# Altium footprint library LJ_Mosfet_Power.PcbLib: 96 footprints (part 3 of 6)
Each footprint in its own frame and in the unit in brackets; x right, y up, seen from the top. Pads: shape width x height; smd on the part's side, far side on the other; paste and mask are expansions set on the pad; w line width, h text height; cw(c..) or ccw(c..) is an arc to the next point about the centre after c.
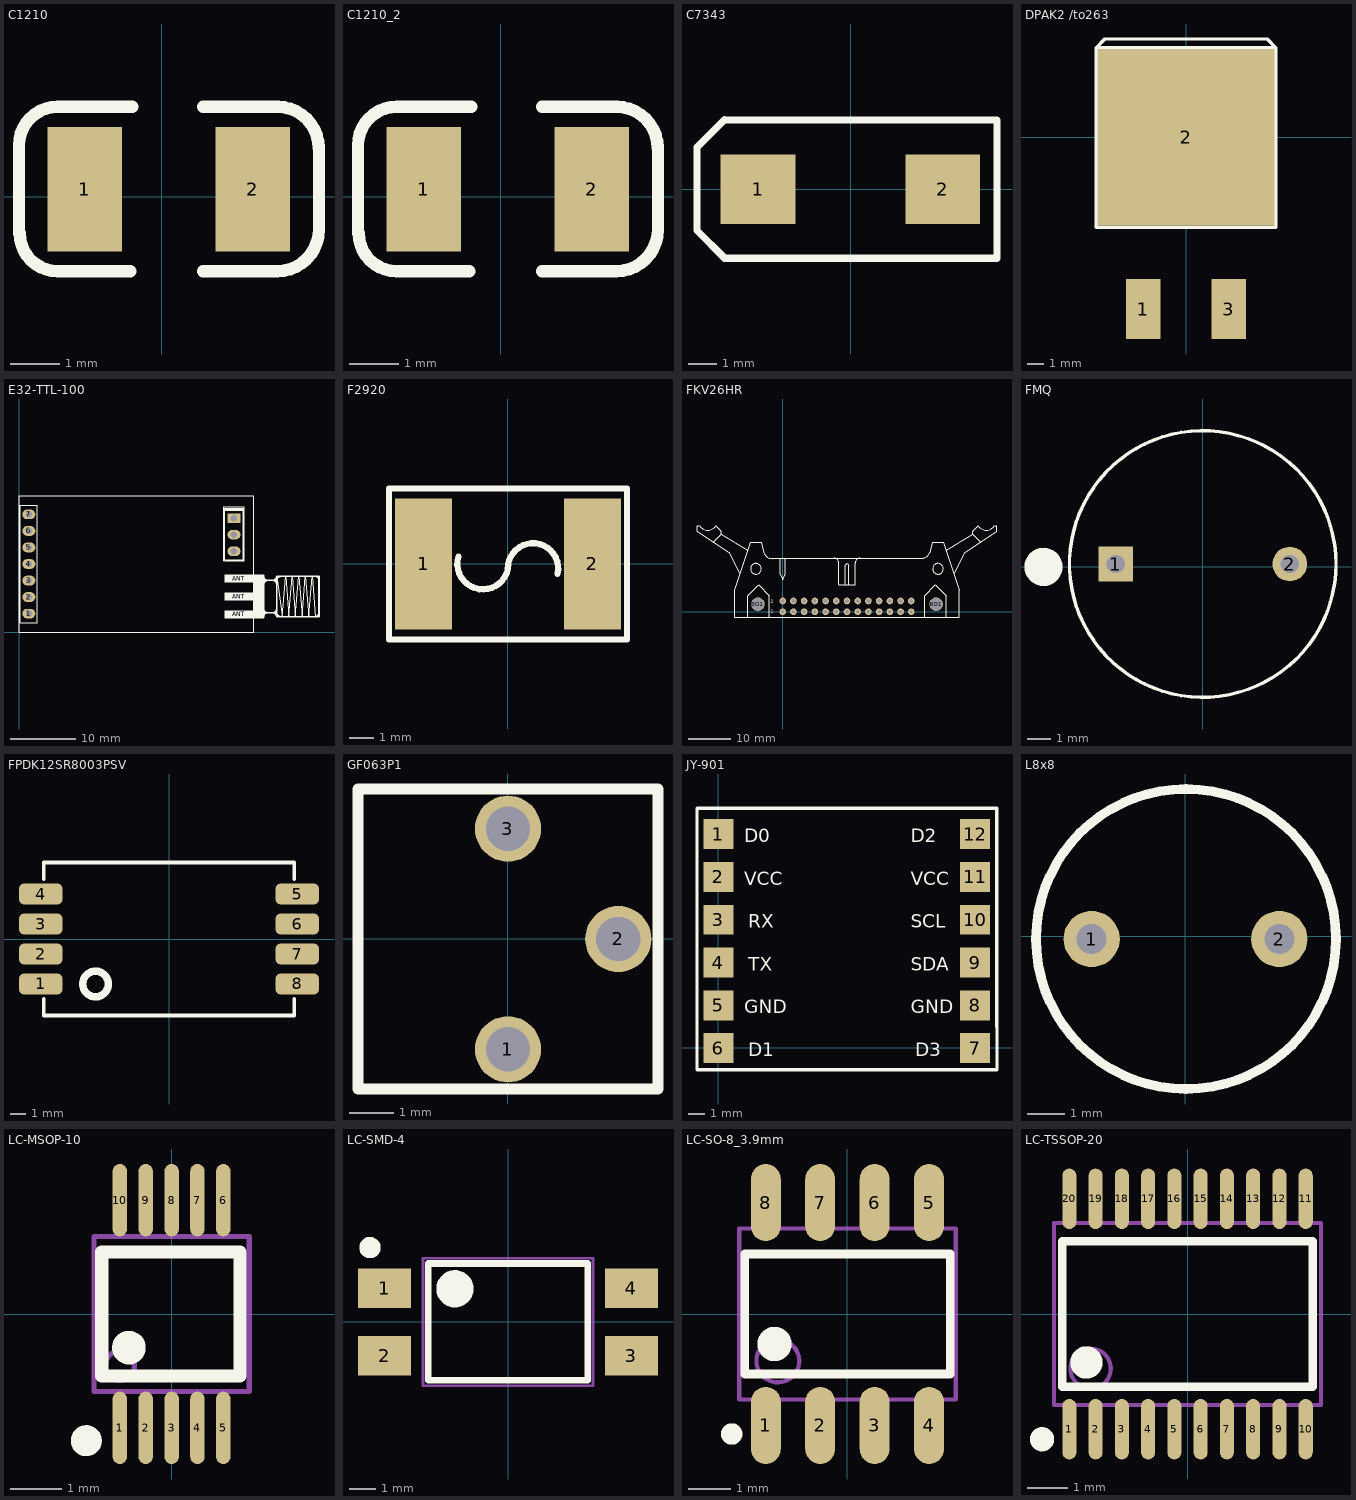
[diagram p2: the footprints below, top view; thin cyan lines are the x and y axes]

## C1210 [mil]
pads (2):
  rect 60x100 smd: 1(-62,6) 2(73,6)
Top Overlay:
  lines w10: -114.8,-29.36 -114.8,41.08 cw(c-83.75,41.08) -83.75,72.13 ; -114.27,-29.36 ccw(c-83.63,-29.36) -83.63,-60 -25.3,-60 ; -83.75,72 -24,72 ; 33,-60 92.52,-60 ccw(c92.52,-26.32) 126.2,-26.32 126.2,39.82 ; 33,72 93.32,72 ; 93,72 cw(c93,39.12) 125.88,39.12
3D body "1210(3225M) Cap.STEP": height 67.1, standoff 0, extent -72.75,-43.99 84.75,54.01

## C1210_2 [mil]
pads (2):
  rect 60x100 smd: 1(-62,6) 2(73,6)
Top Overlay:
  lines w10: -114.8,-29.36 -114.8,41.08 cw(c-83.75,41.08) -83.75,72.13 ; -114.27,-29.36 ccw(c-83.63,-29.36) -83.63,-60 -25.3,-60 ; -83.75,72 -24,72 ; 33,-60 92.52,-60 ccw(c92.52,-26.32) 126.2,-26.32 126.2,39.82 ; 33,72 93.32,72 ; 93,72 cw(c93,39.12) 125.88,39.12
3D body "1210(3225M) Cap.STEP": height 67.1, standoff 0, extent -72.75,-44 84.75,54

## C7343 [mm] "D型"
pads (2):
  rect 2.6x2.4 smd: 1(-3.202,0.007) 2(3.198,0.007)
Top Overlay:
  lines w0.254: -4.369,-2.388 5.08,-2.388 5.08,2.388 ; -4.362,-2.388 -5.325,-1.425 -5.325,1.457 -4.369,2.413 5.08,2.406
3D body "TAJ-D.STEP": height 2.9, standoff 0, extent -3.65,-2.124 3.65,2.176
3D body: height 0.3, standoff 0, extent 3.308,-0.855 3.512,0.915
3D body: height 0.3, standoff 0, extent -3.487,-0.869 -3.392,0.82

## DPAK2 /to263 [mm]
pads (3):
  rect 2.032x3.556 smd: 1(-2.54,-10.2) 3(2.54,-10.2)
  rect 10.5x10.5 smd: 2(0,0)
Top Overlay:
  lines w0.203: -5.334,5.334 5.334,5.334 ; -5.334,5.334 -5.334,-5.334 5.334,-5.334 5.334,5.334 ; -5.334,5.334 -4.826,5.842 4.826,5.842 5.334,5.334

## E32-TTL-100 [mm] "无线模块"
pads (13):
  oval 2x1.5 hole 0.9: 1(1.51,2.88) 2(1.51,5.42) 3(1.51,7.96) 4(1.51,10.5) 5(1.51,13.04) 6(1.51,15.58) 7(1.51,18.12)
  rect 4.5x1.2 on Top Overlay: ANT(33.8,2.75) ANT(33.8,5.5) ANT(33.8,8.25)
  oval 2x1.5 hole 1: NUL(33,12.46) NUL(33,15)
  rect 2x1.5 hole 1: NUL(33,17.54)
Top Overlay:
  region: 31.62,19.09 31.62,18.78 34.42,18.78 34.42,19.09
  rectangle: 36.05,2.25 37.55,8.75
  lines w0.1: 39.55,8.6 40.4,2.4 40.92,8.6 41.43,2.4 41.94,8.6 42.42,2.4 42.94,8.6 43.45,2.4 43.94,8.6 44.46,2.4 44.98,8.6 45.49,2.4 ; 0,0 36.068,0 36.068,21 0,21 0,0
  lines w0.127: 31.62,18.78 31.62,11.19 34.42,11.19 34.42,18.78 ; 31.62,18.78 31.62,19.09 34.42,19.09 34.42,18.78 ; 31.62,18.78 34.42,18.78 ; 0.21,1.5 2.81,1.5 2.81,19.5 0.21,19.5 0.21,1.5 ; 31.41,10.99 34.6,10.99 34.6,19.28 31.41,19.28 31.41,10.99
  lines w0.254: 37.38,3 39.55,3 ; 37.55,2.45 cw(c38.1,2.45) 38.1,3 38.95,3 cw(c38.95,2.4) 39.55,2.4 ; 37.55,4.02 37.55,3.65 ccw(c38.2,3.65) 38.2,3 38.92,3 ccw(c38.92,3.63) 39.55,3.63 ; 37.55,6.38 37.55,7.3 cw(c38.25,7.3) 38.25,8 38.95,8 ; 37.55,8 39.55,8 ; 39.55,3.08 ccw(c40.23,3.08) 40.23,2.4 40.38,2.4 ; 39.55,7.4 ccw(c38.95,7.4) 38.95,8 ; 39.55,7.99 cw(c40.16,7.99) 40.16,8.6 ; 45.11,8.6 45.51,8.6 cw(c45.51,8.06) 46.05,8.06 ; 45.2,2.4 45.43,2.4 ccw(c45.43,3.02) 46.05,3.02 ; 37.55,8.75 37.55,8.63 ccw(c38.18,8.63) 38.18,8 38.95,8 ; 37.55,8.75 37.55,2.25 36.05,2.25 36.05,8.75 37.55,8.75 ; 38.95,8 ccw(c38.95,8.6) 39.55,8.6 ; 39.55,2.4 46.05,2.4 46.05,8.6 39.55,8.6 ; 39.55,2.4 39.55,8.6

## F2920 [mm] "7452"
pads (2):
  rect 2.3x5.3 smd: 1(-3.4,0) 2(3.4,0)
Top Overlay:
  lines w0.254: -2,0.3 ccw(c-1.012,0.007) 0.018,0 ; -0.009,-0.2 cw(c1.008,-0.178) 2,-0.4 ; -4.8,-3.048 -4.8,3.048 4.8,3.048 4.8,-3.048 -4.8,-3.048
3D body: height 1, standoff 0, extent -2.878,-2.718 3.18,2.667
3D body: height 1, standoff 0, extent -3.576,-2.718 -2.878,2.667
3D body: height 1, standoff 0, extent 2.7,-2.692 3.399,2.692

## FKV26HR [mil]
pads (28):
  round 62 hole 35: 1(0,0) 2(0,100) 3(100,0) 4(100,100) 5(200,0) 6(200,100) 7(300,0) 8(300,100) 9(400,0) 10(400,100) 11(500,0) 12(500,100) 13(600,0) 14(600,100) 15(700,0) 16(700,100) 17(800,0) 18(800,100) 19(900,0) 20(900,100) 21(1000,0) 22(1000,100) 23(1100,0) 24(1100,100) 25(1200,0) 26(1200,100)
  round 126 hole 116: BO1(1431.67,70) BO2(-231.67,70)
Top Overlay:
  circle w8: c-250,400 r50
  circle w8: c1450,400 r50
  lines w8: -775,800 -800,800 -800,750 -500,550 -400,350 ; -774.61,799.67 ccw(c-700,850) -625.39,799.67 ; -650,650 -575,725 ; -625,800 -575,750 -575,725 ; -325,-50 -325,150 -225,250 -125,150 -125,-50 ; -325,575 -575,725 ; -175.29,550.54 ccw(c-100,575) -100,495.83 ; -175,550 -200,650 -300,650 -450,200 -450,-50 1650,-50 1650,200 1500,650 1400,650 1375,550 ; -100,500 1300,500 ccw(c1300,575) 1371.33,551.82 ; -25,500 -25,350 0,300 25,350 25,500 ; 475,500 cw(c475,450) 525,450 525,250 675,250 675,450 cw(c725,450) 725,500 ; 583.33,250 583.33,433.33 600,450 616.67,433.33 616.67,250 ; 1325,-50 1325,150 1425,250 1525,150 1525,-50 ; 1525,575 1775,725 ; 1600,350 1700,550 2000,750 2000,800 1975,800 ; 1825,800 1775,750 1775,725 ; 1825.39,799.67 ccw(c1900,850) 1974.61,799.67 ; 1850,650 1775,725
  text "1" at -111,-14 h31.5
  text "2" at -111,80 h31.5

## FMQ [mm]
pads (2):
  rect 1.5x1.5 hole 0.8: 1(-3.775,0.127)
  round 1.5 hole 0.8: 2(3.775,0.127)
Top Overlay:
  circle w0.15: c0,0.127 r5.778
  circle w1: c-6.901,0.002 r0.326

## FPDK12SR8003PSV [mm] "5.6-14.0Vdc Input, 3A, 0.8-6.6Vdc Output"
pads (8):
  rrect50% 2.9x1.4 smd: 1(-8.55,-3) 2(-8.55,-1) 3(-8.55,1) 4(-8.55,3) 5(8.55,3) 6(8.55,1) 7(8.55,-1) 8(8.55,-3)
Top Overlay:
  circle w0.5: c-4.9,-3 r0.854
  lines w0.254: -8.35,-4 -8.35,-5.1 8.35,-5.1 8.35,-4 ; -8.35,4 -8.35,5.1 8.35,5.1 8.35,4

## GF063P1 [mm] "TOCOS 1/4’’ Square, Single-Turn, Through-Hole Sealed Cermet Trimmers"
pads (3):
  round 1.5 hole 1: 1(0,-2.5) 2(2.5,0) 3(0,2.5)
Top Overlay:
  lines w0.254: -3.4,-3.4 3.4,-3.4 3.4,3.4 -3.4,3.4 -3.4,-3.4

## JY-901 [mil]
pads (12):
  rect 70x70 smd: 1(0.63,499.63) 2(0.63,399.63) 3(0.63,299.63) 4(0.63,199.63) 5(0.63,99.63) 6(0.63,-0.37) 7(600.63,-0.37) 8(600.63,99.63) 9(600.63,199.63) 10(600.63,299.63) 11(600.63,399.63) 12(600.63,499.63)
Top Overlay:
  lines w7.87: -49.37,49.63 -49.37,449.63 ; 650.63,449.63 650.63,49.63 651.63,49.63
  lines w8: -49.37,49.63 -49.37,-51.37 651.63,-51.37 651.63,49.63 ; -49.37,449.63 -49.37,560.63 650.63,560.63 650.63,449.63
  text "D3" at 460.63,-19.37 h31.5
  text "D2" at 450.63,480.63 h31.5
  text "D1" at 70.63,-19.37 h31.5
  text "D0" at 60.63,480.63 h31.5
  text "SCL" at 450.63,280.63 h31.5
  text "SDA" at 450.63,180.63 h31.5
  text "TX" at 70.63,180.63 h31.5
  text "RX" at 70.63,280.63 h31.5
  text "GND" at 450.63,80.63 h31.5
  text "GND" at 60.63,80.63 h31.5
  text "VCC" at 450.63,380.63 h31.5
  text "VCC" at 60.63,380.63 h31.5

## L8x8 [mm] "L?"
pads (2):
  round 1.5 hole 0.8: 1(-2.489,-0.076) 2(2.515,-0.076)
Top Overlay:
  circle w0.254: c0.025,-0.076 r4
3D body "Inductor.step": height 11.2, standoff -5, extent -4.134,-4.236 4.166,4.064

## LC-MSOP-10 [mm]
pads (10):
  oval 0.28x1.4 smd mask+0.051: 1(-1,-2.2) 2(-0.5,-2.2) 3(0,-2.2) 4(0.5,-2.2) 5(1,-2.2) 6(1,2.2) 7(0.5,2.2) 8(0,2.2) 9(-0.5,2.2) 10(-1,2.2)
Top Overlay:
  circle w0.3: c-1.65,-2.45 r0.15
  circle w0.4: c-0.825,-0.65 r0.125
  lines w0.254: -1.35,-1.2 1.325,-1.2 1.325,1.2 -1.35,1.2 -1.35,-1.2
Mechanical 13:
  circle w0.1: c-1,-1 r0.283
  lines w0.1: -1.5,-1.5 -1.5,1.5 1.5,1.5 1.5,-1.5 -1.5,-1.5

## LC-SMD-4 [mm]
pads (4):
  rect 2x1.5 smd: 1(-4.65,1.27) 2(-4.65,-1.27) 3(4.65,-1.27) 4(4.65,1.27)
Top Overlay:
  circle w0.7: c-2,1.25 r0.35
  circle w0.4: c-5.2,2.8 r0.2
  lines w0.254: -3,-2.2 3,-2.2 3,2.2 -3,2.2 -3,-2.2
Mechanical 13:
  lines w0.1: -3.2,-2.4 -3.2,2.4 3.2,2.4 3.2,-2.4 -3.2,-2.4
3D body "User Library-DIP4_opto_iso.STEP": height 3.9, standoff 0, extent -5.015,-2.416 5.015,2.416

## LC-SO-8_3.9mm [mm]
pads (8):
  oval 0.7x1.8 smd: 1(-1.905,-2.6) 2(-0.635,-2.6) 3(0.635,-2.6) 4(1.905,-2.6) 5(1.905,2.6) 6(0.635,2.6) 7(-0.635,2.6) 8(-1.905,2.6)
Top Overlay:
  circle w0.25: c-2.7,-2.8 r0.125
  circle w0.4: c-1.7,-0.7 r0.2
  lines w0.2: -2.4,-1.4 -2.4,1.4 2.4,1.4 2.4,-1.4 -2.4,-1.4
Mechanical 13:
  circle w0.1: c-1.625,-1.095 r0.5
  lines w0.1: -2.525,-1.995 -2.525,1.995 2.525,1.995 2.525,-1.995 -2.525,-1.995

## LC-TSSOP-20 [mm]
pads (20):
  oval 0.35x1.5 smd: 1(-2.925,-2.85) 2(-2.275,-2.85) 3(-1.625,-2.85) 4(-0.975,-2.85) 5(-0.325,-2.85) 6(0.325,-2.85) 7(0.975,-2.85) 8(1.625,-2.85) 9(2.275,-2.85) 10(2.925,-2.85) 11(2.925,2.85) 12(2.275,2.85) 13(1.625,2.85) 14(0.975,2.85) 15(0.325,2.85) 16(-0.325,2.85) 17(-0.975,2.85) 18(-1.625,2.85) 19(-2.275,2.85) 20(-2.925,2.85)
Top Overlay:
  circle w0.4: c-2.5,-1.2 r0.2
  circle w0.3: c-3.6,-3.1 r0.15
  lines w0.2: -3.1,-1.8 3.1,-1.8 3.1,1.8 -3.1,1.8 -3.1,-1.8
Mechanical 13:
  circle w0.1: c-2.4,-1.35 r0.5
  lines w0.1: -3.3,-2.25 3.3,-2.25 3.3,2.25 -3.3,2.25 -3.3,-2.25